# Altium footprint library 04.连接器件.pcb.PCBLIB: 363 footprints (part 14 of 23)
Each footprint in its own frame and in the unit in brackets; x right, y up, seen from the top. Pads: shape width x height; smd on the part's side, far side on the other; paste and mask are expansions set on the pad; w line width, h text height; cw(c..) or ccw(c..) is an arc to the next point about the centre after c.
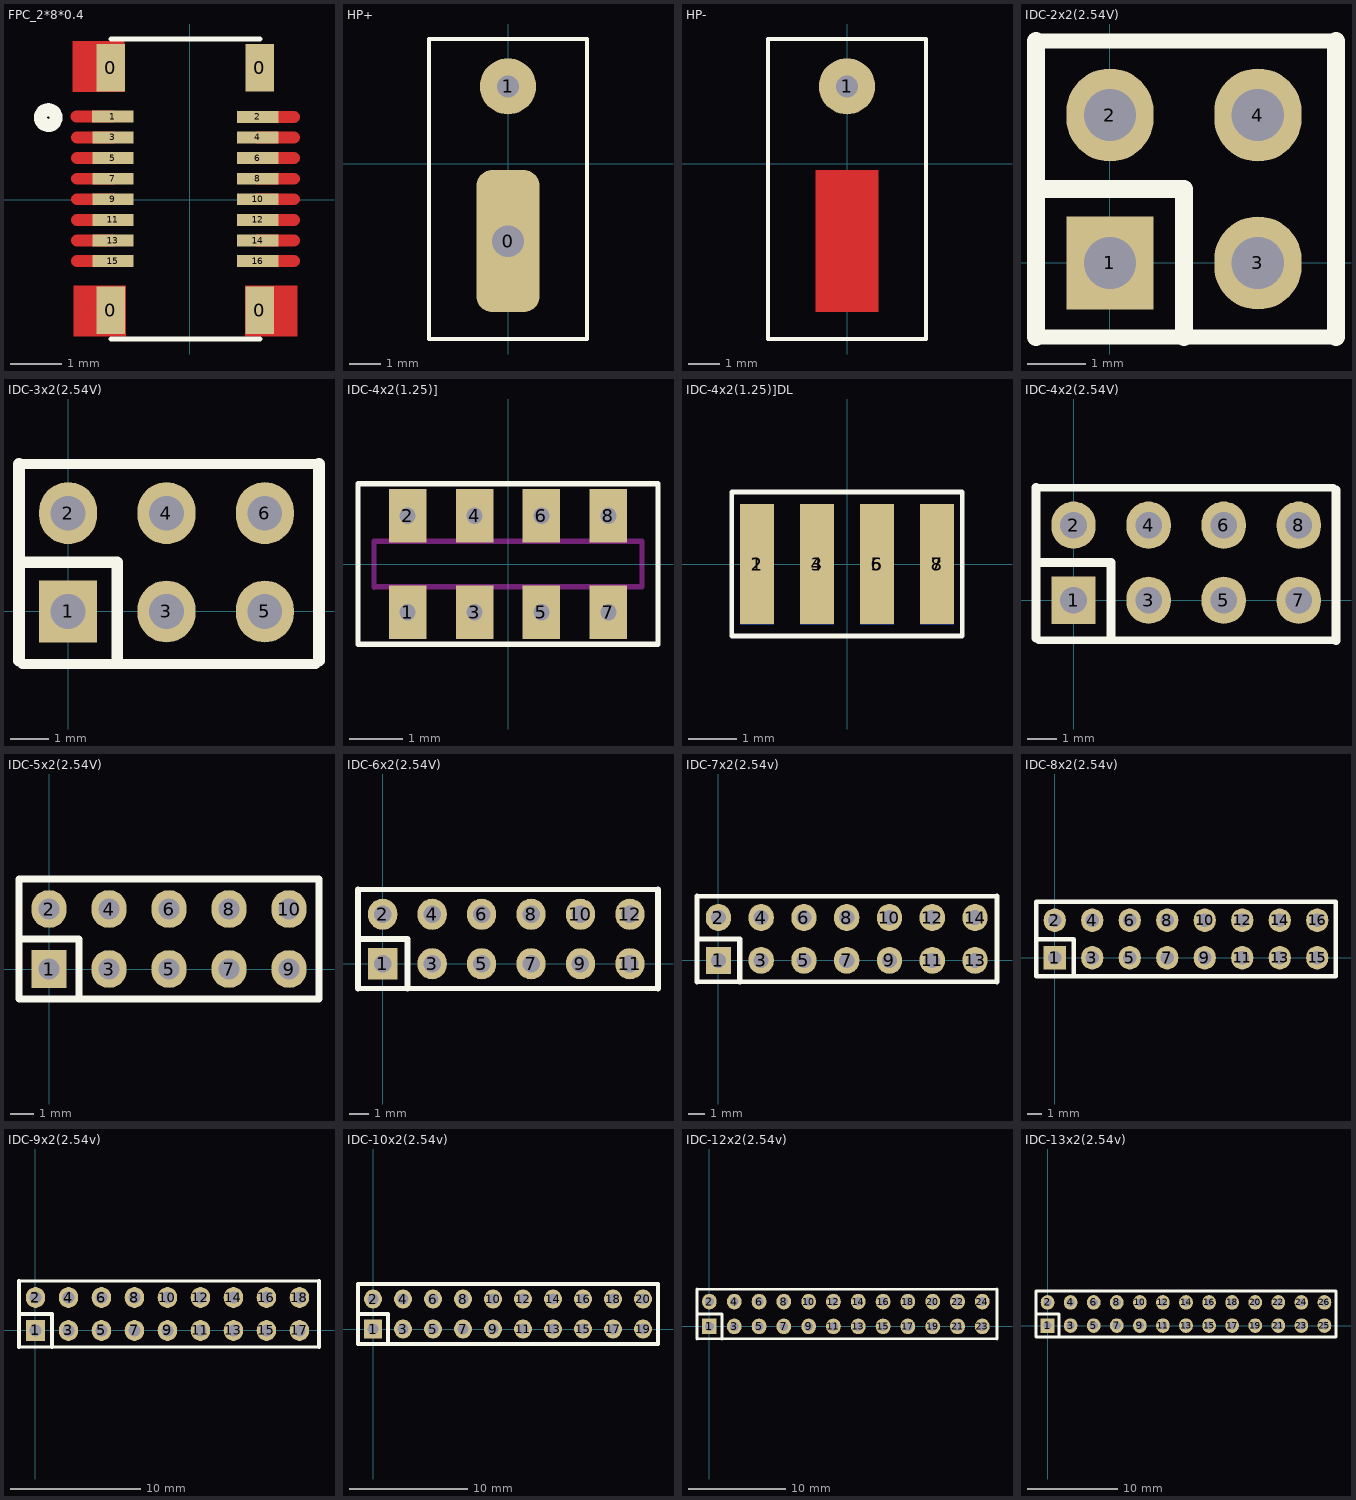
[diagram p13: the footprints below, top view; thin cyan lines are the x and y axes]

## FPC_2*8*0.4 [mm]
pads (20):
  rect 0.55x0.92 smd: 0(-1.536,-2.143) 0(-1.536,2.557) 0(1.354,-2.143) 0(1.354,2.557)
  rect 0.8x0.23 smd: 1(-1.5,1.612) 2(1.314,1.607) 3(-1.496,1.207) 4(1.314,1.207) 5(-1.496,0.807) 6(1.314,0.807) 7(-1.496,0.407) 8(1.314,0.407) 9(-1.496,0.007) 10(1.314,0.007) 11(-1.496,-0.393) 12(1.314,-0.393) 13(-1.496,-0.793) 14(1.314,-0.793) 15(-1.496,-1.193) 16(1.314,-1.193)
TopLayer:
  rectangle: -2.283,2.091 -1.267,3.082
  region: 2.086,-1.668 1.07,-1.668 1.07,-2.658 2.086,-2.658
  rectangle: -2.258,-2.658 -1.242,-1.668
  lines w0.23: -2.2,1.612 -1.5,1.612 ; -2.196,-1.193 -1.496,-1.193 ; -2.196,-0.793 -1.496,-0.793 ; -2.196,-0.393 -1.496,-0.393 ; -2.196,0.007 -1.496,0.007 ; -2.196,0.407 -1.496,0.407 ; -2.196,0.807 -1.496,0.807 ; -2.196,1.207 -1.496,1.207 ; 1.314,-1.193 2.014,-1.193 ; 1.314,-0.793 2.014,-0.793 ; 1.314,-0.393 2.014,-0.393 ; 1.314,0.007 2.014,0.007 ; 1.314,0.407 2.014,0.407 ; 1.314,0.807 2.014,0.807 ; 1.314,1.207 2.014,1.207 ; 1.314,1.607 2.014,1.607
TopOverlay:
  circle w0.254: c-2.749,1.593 r0.152
  lines w0.1: -1.536,-2.703 1.354,-2.703 ; -1.536,3.117 1.354,3.117
TopSolder:
  rectangle: -2.283,2.091 -1.267,3.082
  region: 2.086,-1.668 1.07,-1.668 1.07,-2.658 2.086,-2.658
  rectangle: -2.258,-2.658 -1.242,-1.668
  lines w0.23: -2.196,-1.193 -1.496,-1.193 ; -2.196,-0.793 -1.496,-0.793 ; -2.196,-0.393 -1.496,-0.393 ; -2.196,0.007 -1.496,0.007 ; -2.196,0.407 -1.496,0.407 ; -2.196,1.207 -1.496,1.207 ; -2.196,1.607 -1.496,1.607 ; 1.314,-1.193 2.014,-1.193 ; 1.314,-0.793 2.014,-0.793 ; 1.314,-0.393 2.014,-0.393 ; 1.314,0.007 2.014,0.007 ; 1.314,0.407 2.014,0.407 ; 1.314,1.207 2.014,1.207 ; 1.314,1.607 2.014,1.607 ; 1.314,0.807 2.014,0.807 1.314,0.807
3D body: height 2.5, standoff 0.5, extent -2.008,-2.73 1.799,3.124

## HP+ [mm]
pads (2):
  rrect50% 2x4.5 hole 1: 0(0,-2.45)
  round 1.778 hole 0.7: 1(0,2.45)
TopOverlay:
  lines w0.127: -2.5,-5.55 2.5,-5.55 2.5,3.95 -2.5,3.95 -2.5,-5.55

## HP- [mm]
pads (1):
  round 1.778 hole 0.7: 1(0,2.45)
TopLayer:
  rectangle: -1,-4.7 1,-0.2
TopOverlay:
  lines w0.127: -2.5,-5.55 2.5,-5.55 2.5,3.95 -2.5,3.95 -2.5,-5.55

## IDC-2x2(2.54V) [mm]
pads (4):
  rect 1.5x1.6 hole 0.9: 1(0,0)
  oval 1.5x1.6 hole 0.9: 2(0,2.54) 3(2.54,0) 4(2.54,2.54)
TopOverlay:
  lines w0.254: -1.27,-1.27 3.88,-1.27 ; -1.27,3.81 3.88,3.81
  lines w0.305: -1.27,-1.27 -1.27,3.81 ; -1.27,1.27 1.27,1.27 1.27,-1.27 ; 3.88,-1.27 3.88,3.81

## IDC-3x2(2.54V) [mm]
pads (6):
  rect 1.5x1.6 hole 0.9: 1(0,0)
  oval 1.5x1.6 hole 0.9: 2(0,2.54) 3(2.54,0) 4(2.54,2.54) 5(5.08,0) 6(5.08,2.54)
TopOverlay:
  lines w0.254: -1.27,-1.27 -1.184,-1.356 6.394,-1.356 6.48,-1.27 ; -1.27,3.81 6.48,3.81
  lines w0.305: -1.27,-1.27 -1.27,3.81 ; -1.27,1.27 1.27,1.27 1.27,-1.27 ; 6.48,-1.27 6.48,3.81

## IDC-4x2(1.25)] [mm]
pads (8):
  rect 0.7x1 hole 0.3: 1(-1.875,-0.9) 2(-1.875,0.9) 3(-0.625,-0.9) 4(-0.625,0.9) 5(0.625,-0.9) 6(0.625,0.9) 7(1.875,-0.9) 8(1.875,0.9)
TopOverlay:
  lines w0.1: -2.8,-1.5 2.8,-1.5 2.8,1.5 -2.8,1.5 -2.8,-1.5
KeepOutLayer:
  lines w0.1: -2.5,-0.433 -2.5,0.417 ; -2.5,-0.425 2.5,-0.425 ; -2.5,0.425 2.5,0.425 ; 2.5,-0.421 2.5,0.429

## IDC-4x2(1.25)]DL [mm]
pads (8):
  rect 0.7x2.5 smd far side: 1(-1.875,0) 3(-0.625,0) 5(0.625,0) 7(1.875,0)
  rect 0.7x2.5 smd: 2(-1.875,0) 4(-0.625,0) 6(0.625,0) 8(1.875,0)
TopOverlay:
  lines w0.1: -2.4,-1.5 -2.4,1.5 2.4,1.5 2.4,-1.5 -2.4,-1.5

## IDC-4x2(2.54V) [mm]
pads (8):
  rect 1.5x1.6 hole 0.9: 1(0,0)
  oval 1.5x1.6 hole 0.9: 2(0,2.54) 3(2.54,0) 4(2.54,2.54) 5(5.08,0) 6(5.08,2.54) 7(7.62,0) 8(7.62,2.54)
TopOverlay:
  lines w0.254: -1.27,-1.27 -1.184,-1.356 8.88,-1.356 ; -1.27,3.81 8.794,3.81 8.88,3.724
  lines w0.305: -1.27,-1.27 -1.27,3.81 ; -1.27,1.27 1.27,1.27 1.27,-1.27 ; 8.88,-1.356 8.88,3.724
3D body "HDR2X4.STEP": height 8.38, standoff -3.81, extent -1.321,-1.219 8.839,3.861

## IDC-5x2(2.54V) [mm]
pads (10):
  rect 1.5x1.6 hole 0.9: 1(0,0)
  oval 1.5x1.6 hole 0.9: 2(0,2.54) 3(2.54,0) 4(2.54,2.54) 5(5.08,0) 6(5.08,2.54) 7(7.62,0) 8(7.62,2.54) 9(10.16,0) 10(10.16,2.54)
TopOverlay:
  lines w0.305: -1.27,1.27 1.27,1.27 1.27,-1.27 ; -1.27,-1.27 -1.27,3.81 11.43,3.81 11.43,-1.27 -1.27,-1.27
3D body "HDR2X5.STEP": height 8.38, standoff -3.81, extent -1.245,-1.194 11.455,3.886

## IDC-6x2(2.54V) [mm]
pads (12):
  rect 1.5x1.6 hole 0.9: 1(0,0)
  oval 1.5x1.6 hole 0.9: 2(0,2.54) 3(2.54,0) 4(2.54,2.54) 5(5.08,0) 6(5.08,2.54) 7(7.62,0) 8(7.62,2.54) 9(10.16,0) 10(10.16,2.54) 11(12.7,0) 12(12.7,2.54)
TopOverlay:
  lines w0.254: -1.27,-1.27 14.144,-1.27 ; -1.27,3.81 14.144,3.81
  lines w0.305: -1.27,-1.27 -1.27,3.81 ; -1.27,1.27 1.27,1.27 1.27,-1.27 ; 14.144,-1.27 14.144,3.81

## IDC-7x2(2.54v) [mm]
pads (14):
  rect 1.5x1.6 hole 0.9: 1(0,0)
  oval 1.5x1.6 hole 0.9: 2(0,2.54) 3(2.54,0) 4(2.54,2.54) 5(5.08,0) 6(5.08,2.54) 7(7.62,0) 8(7.62,2.54) 9(10.16,0) 10(10.16,2.54) 11(12.7,0) 12(12.7,2.54) 13(15.24,0) 14(15.24,2.54)
TopOverlay:
  lines w0.254: -1.27,-1.27 -1.264,-1.276 16.544,-1.276 ; -1.27,3.81 16.538,3.81 16.544,3.804
  lines w0.305: -1.27,-1.27 -1.27,3.81 ; -1.27,1.27 1.27,1.27 1.27,-1.27 ; 16.544,-1.276 16.544,3.804
3D body "HDR2X7.STEP": height 3.81, standoff -8.38, extent -1.321,-1.321 16.459,3.759

## IDC-8x2(2.54v) [mm]
pads (16):
  rect 1.5x1.6 hole 0.9: 1(0,0)
  oval 1.5x1.6 hole 0.9: 2(0,2.54) 3(2.54,0) 4(2.54,2.54) 5(5.08,0) 6(5.08,2.54) 7(7.62,0) 8(7.62,2.54) 9(10.16,0) 10(10.16,2.54) 11(12.7,0) 12(12.7,2.54) 13(15.24,0) 14(15.24,2.54) 15(17.78,0) 16(17.78,2.54)
TopOverlay:
  lines w0.305: -1.27,1.27 1.27,1.27 1.27,-1.27 ; -1.27,-1.27 19.05,-1.27 19.05,3.81 -1.27,3.81 -1.27,-1.27
3D body "HDR2X8.STEP": height 8.38, standoff -3.81, extent -1.245,-1.321 19.075,3.759

## IDC-9x2(2.54v) [mm]
pads (18):
  rect 1.5x1.6 hole 0.9: 1(0,0)
  oval 1.5x1.6 hole 0.9: 2(0,2.54) 3(2.54,0) 4(2.54,2.54) 5(5.08,0) 6(5.08,2.54) 7(7.62,0) 8(7.62,2.54) 9(10.16,0) 10(10.16,2.54) 11(12.7,0) 12(12.7,2.54) 13(15.24,0) 14(15.24,2.54) 15(17.78,0) 16(17.78,2.54) 17(20.32,0) 18(20.32,2.54)
TopOverlay:
  lines w0.254: -1.27,-1.27 21.824,-1.27 ; -1.27,3.81 21.824,3.81
  lines w0.305: -1.27,-1.27 -1.27,3.81 ; -1.27,1.27 1.27,1.27 1.27,-1.27 ; 21.824,-1.27 21.824,3.81
3D body "HDR2X9.STEP": height 8.38, standoff -3.81, extent -1.118,-1.346 21.742,3.734

## IDC-10x2(2.54v) [mm]
pads (20):
  rect 1.5x1.6 hole 0.9: 1(0,0)
  oval 1.5x1.6 hole 0.9: 2(0,2.54) 3(2.54,0) 4(2.54,2.54) 5(5.08,0) 6(5.08,2.54) 7(7.62,0) 8(7.62,2.54) 9(10.16,0) 10(10.16,2.54) 11(12.7,0) 12(12.7,2.54) 13(15.24,0) 14(15.24,2.54) 15(17.78,0) 16(17.78,2.54) 17(20.32,0) 18(20.32,2.54) 19(22.86,0) 20(22.86,2.54)
TopOverlay:
  lines w0.305: -1.27,1.27 1.27,1.27 1.27,-1.27 ; -1.27,-1.27 -1.27,3.81 24.13,3.81 24.13,-1.27 -1.27,-1.27
3D body "HDR2X10.STEP": height 8.38, standoff -3.81, extent -1.194,-1.295 24.206,3.785

## IDC-12x2(2.54v) [mm]
pads (24):
  rect 1.5x1.6 hole 0.9: 1(0,0)
  oval 1.5x1.6 hole 0.9: 2(0,2.54) 3(2.54,0) 4(2.54,2.54) 5(5.08,0) 6(5.08,2.54) 7(7.62,0) 8(7.62,2.54) 9(10.16,0) 10(10.16,2.54) 11(12.7,0) 12(12.7,2.54) 13(15.24,0) 14(15.24,2.54) 15(17.78,0) 16(17.78,2.54) 17(20.32,0) 18(20.32,2.54) 19(22.86,0) 20(22.86,2.54) 21(25.4,0) 22(25.4,2.54) 23(27.94,0) 24(27.94,2.54)
TopOverlay:
  lines w0.254: -1.27,-1.27 29.444,-1.27 ; -1.27,3.81 29.444,3.81
  lines w0.305: -1.27,-1.27 -1.27,3.81 ; -1.27,1.27 1.27,1.27 1.27,-1.27 ; 29.444,-1.27 29.444,3.81

## IDC-13x2(2.54v) [mm]
pads (26):
  rect 1.5x1.6 hole 0.9: 1(0,0)
  oval 1.5x1.6 hole 0.9: 2(0,2.54) 3(2.54,0) 4(2.54,2.54) 5(5.08,0) 6(5.08,2.54) 7(7.62,0) 8(7.62,2.54) 9(10.16,0) 10(10.16,2.54) 11(12.7,0) 12(12.7,2.54) 13(15.24,0) 14(15.24,2.54) 15(17.78,0) 16(17.78,2.54) 17(20.32,0) 18(20.32,2.54) 19(22.86,0) 20(22.86,2.54) 21(25.4,0) 22(25.4,2.54) 23(27.94,0) 24(27.94,2.54) 25(30.48,0) 26(30.48,2.54)
TopOverlay:
  lines w0.305: -1.27,1.27 1.27,1.27 1.27,-1.27 ; -1.27,-1.27 -1.27,3.81 31.75,3.81 31.75,-1.27 -1.27,-1.27